# Altium footprint library lib_eps.PcbLib: 113 footprints (part 8 of 8)
Each footprint in its own frame and in the unit in brackets; x right, y up, seen from the top. Pads: shape width x height; smd on the part's side, far side on the other; paste and mask are expansions set on the pad; w line width, h text height; cw(c..) or ccw(c..) is an arc to the next point about the centre after c.
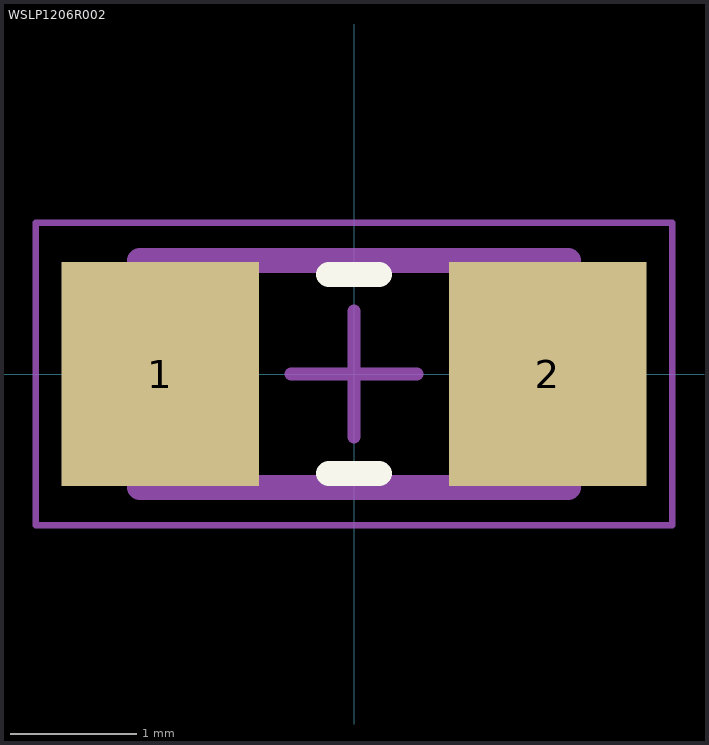
[diagram p7: the footprint, top view; thin cyan lines are the x and y axes]

## WSLP1206R002 [mm] "Chip Resistor, 2-Leads, Body 3,20x1,60mm, IPC Medium Density"
height 0.89
pads (2):
  rect 1.57x1.78 smd: 1(-1.538,0) 2(1.538,0)
Top Overlay:
  lines w0.2: -0.2,-0.79 0.2,-0.79 ; -0.2,0.79 0.2,0.79
Mechanical 13:
  lines w0.1: -1.73,-0.925 1.73,-0.925 1.73,0.925 -1.73,0.925 -1.73,-0.925
Mechanical 15:
  lines w0.05: -2.525,-1.2 2.525,-1.2 2.525,1.2 -2.525,1.2 -2.525,0.425 -2.525,-0.425 -2.525,-1.2
  lines w0.1: -0.5,0 0.5,0 ; 0,-0.5 0,0.5
Mechanical 29:
  lines w0.2: -1.7,-0.9 0,-0.9 1.7,-0.9 1.7,0.9 -1.7,0.9 -1.7,-0.9
  text "'.Designator'" at -1.5,-0.2 h0.6
3D body "WSLP1206R002.step": height 0.89, standoff 0, extent -1.73,-0.925 1.73,0.925